# Altium footprint library CUSTOM PCB.PcbLib: 404 footprints (part 19 of 26)
Each footprint in its own frame and in the unit in brackets; x right, y up, seen from the top. Pads: shape width x height; smd on the part's side, far side on the other; paste and mask are expansions set on the pad; w line width, h text height; cw(c..) or ccw(c..) is an arc to the next point about the centre after c.
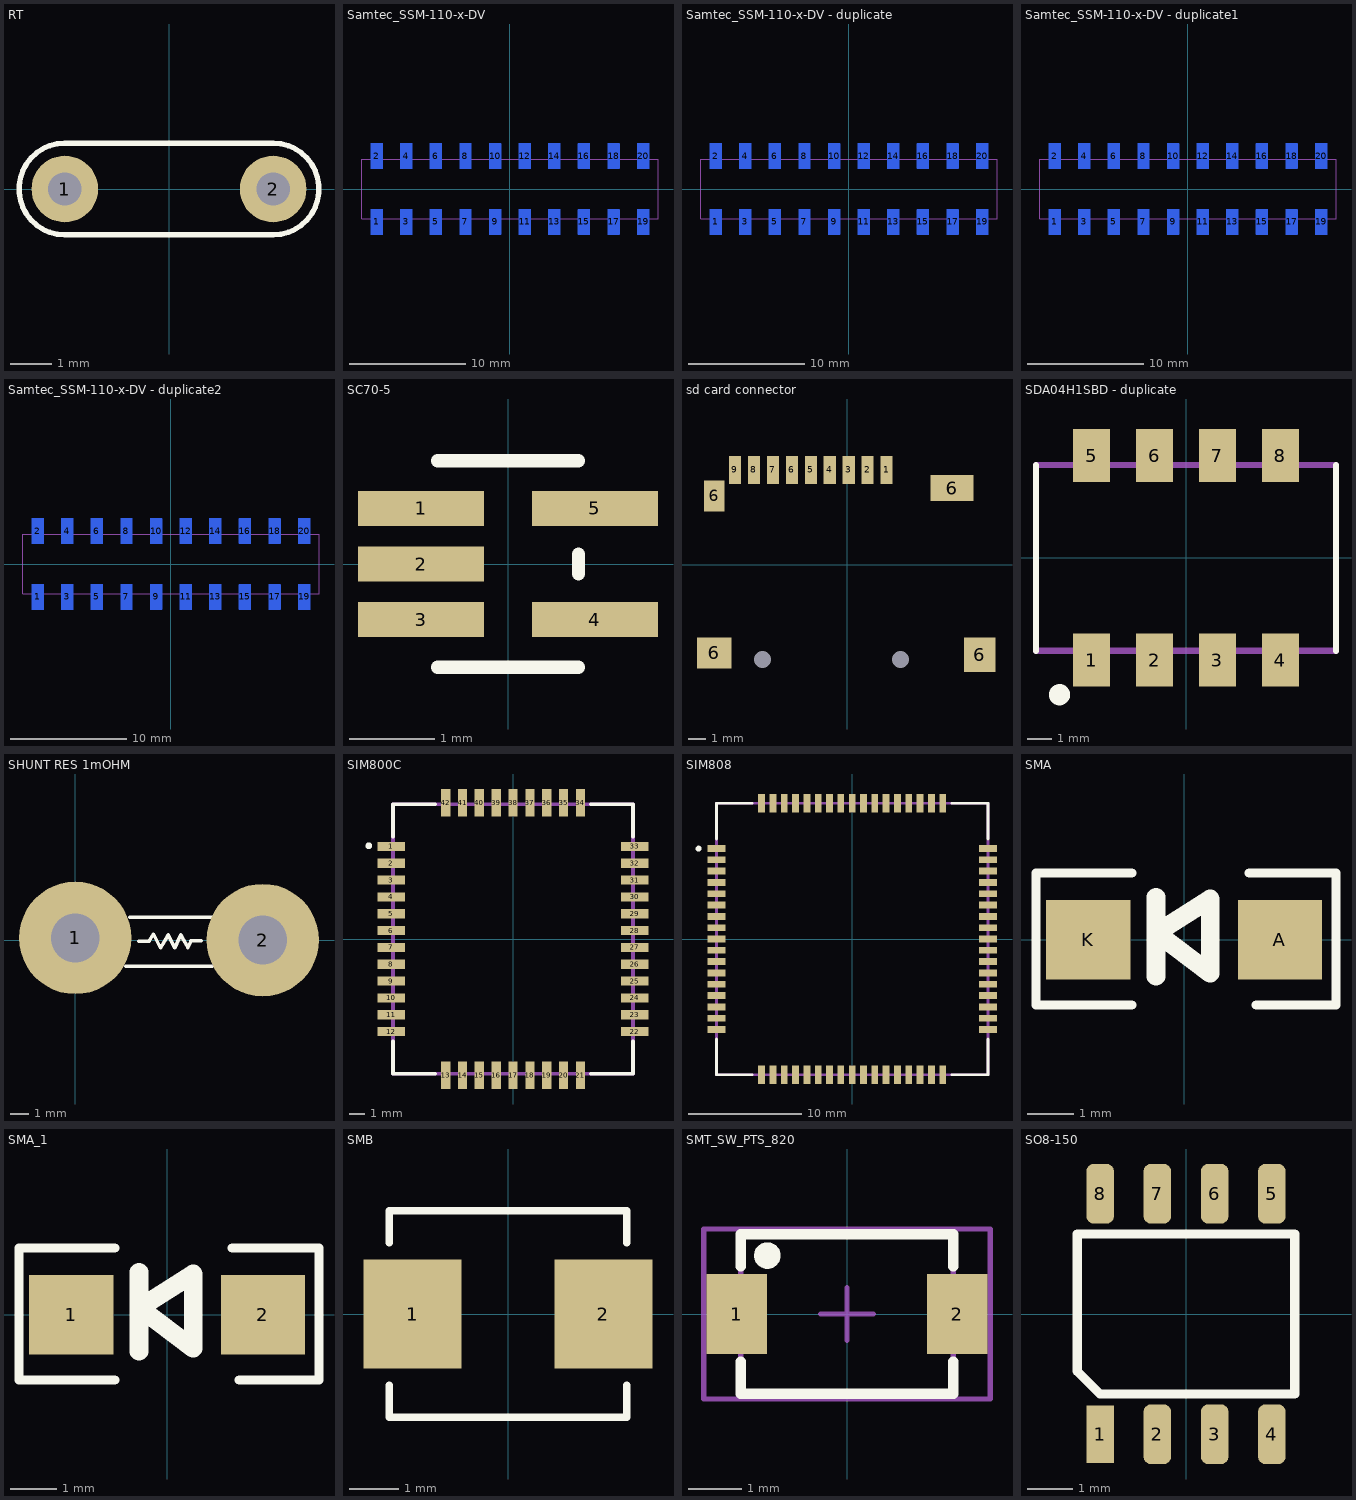
[diagram p18: the footprints below, top view; thin cyan lines are the x and y axes]

## RT [mm]
pads (2):
  round 1.6 hole 0.8: 1(-2.5,0) 2(2.5,0)
Top Overlay:
  lines w0.127: -2.5,-1.1 cw(c-2.5,0) -2.5,1.1 2.5,1.1 cw(c2.5,0) 2.5,-1.1 -2.5,-1.1

## Samtec_SSM-110-x-DV [mm] "Receptacle, 2.54mm, 10x2, SMT"
height 7.47
pads (20):
  rrect10% 1.02x2.22 smd far side: 1(-11.43,-2.825) 2(-11.43,2.825) 3(-8.89,-2.825) 4(-8.89,2.825) 5(-6.35,-2.825) 6(-6.35,2.825) 7(-3.81,-2.825) 8(-3.81,2.825) 9(-1.27,-2.825) 10(-1.27,2.825) 11(1.27,-2.825) 12(1.27,2.825) 13(3.81,-2.825) 14(3.81,2.825) 15(6.35,-2.825) 16(6.35,2.825) 17(8.89,-2.825) 18(8.89,2.825) 19(11.43,-2.825) 20(11.43,2.825)
Bottom Overlay:
  rectangle: -13.025,-2.225 -12.675,-1.625
  lines w0.2: -12.34,-2.54 -12.7,-2.54 -12.7,2.54 -12.34,2.54 ; 12.34,-2.54 12.7,-2.54 12.7,2.54 12.34,2.54
Mechanical 6:
  lines w0.1: -11.684,-2.54 -11.684,-3.518 -11.176,-3.518 -11.176,-2.54 ; -11.684,2.54 -11.684,3.518 -11.176,3.518 -11.176,2.54 ; -9.144,-2.54 -9.144,-3.518 -8.636,-3.518 -8.636,-2.54 ; -9.144,2.54 -9.144,3.518 -8.636,3.518 -8.636,2.54 ; -6.604,-2.54 -6.604,-3.518 -6.096,-3.518 -6.096,-2.54 ; -6.604,2.54 -6.604,3.518 -6.096,3.518 -6.096,2.54 ; -4.064,-2.54 -4.064,-3.518 -3.556,-3.518 -3.556,-2.54 ; -4.064,2.54 -4.064,3.518 -3.556,3.518 -3.556,2.54 ; -1.524,-2.54 -1.524,-3.518 -1.016,-3.518 -1.016,-2.54 ; -1.524,2.54 -1.524,3.518 -1.016,3.518 -1.016,2.54 ; 1.016,-2.54 1.016,-3.518 1.524,-3.518 1.524,-2.54 ; 1.016,2.54 1.016,3.518 1.524,3.518 1.524,2.54 ; 3.556,-2.54 3.556,-3.518 4.064,-3.518 4.064,-2.54 ; 3.556,2.54 3.556,3.518 4.064,3.518 4.064,2.54 ; 6.096,-2.54 6.096,-3.518 6.604,-3.518 6.604,-2.54 ; 6.096,2.54 6.096,3.518 6.604,3.518 6.604,2.54 ; 8.636,-2.54 8.636,-3.518 9.144,-3.518 9.144,-2.54 ; 8.636,2.54 8.636,3.518 9.144,3.518 9.144,2.54 ; 11.176,-2.54 11.176,-3.518 11.684,-3.518 11.684,-2.54 ; 11.176,2.54 11.176,3.518 11.684,3.518 11.684,2.54 ; -12.7,-2.54 12.7,-2.54 12.7,2.54 -12.7,2.54 -12.7,-2.54
  text ".Designator" at -0.182,-0.028 h1.02
3D body "SSM-110-S-DV.stp": height 7.42, standoff 0, extent -12.7,-3.518 12.7,3.518

## Samtec_SSM-110-x-DV - duplicate [mm] "Receptacle, 2.54mm, 10x2, SMT"
height 7.47
pads (20):
  rrect10% 1.02x2.22 smd far side: 1(-11.43,-2.825) 2(-11.43,2.825) 3(-8.89,-2.825) 4(-8.89,2.825) 5(-6.35,-2.825) 6(-6.35,2.825) 7(-3.81,-2.825) 8(-3.81,2.825) 9(-1.27,-2.825) 10(-1.27,2.825) 11(1.27,-2.825) 12(1.27,2.825) 13(3.81,-2.825) 14(3.81,2.825) 15(6.35,-2.825) 16(6.35,2.825) 17(8.89,-2.825) 18(8.89,2.825) 19(11.43,-2.825) 20(11.43,2.825)
Bottom Overlay:
  rectangle: -13.025,-2.225 -12.675,-1.625
  lines w0.2: -12.34,-2.54 -12.7,-2.54 -12.7,2.54 -12.34,2.54 ; 12.34,-2.54 12.7,-2.54 12.7,2.54 12.34,2.54
Mechanical 6:
  lines w0.1: -11.684,-2.54 -11.684,-3.518 -11.176,-3.518 -11.176,-2.54 ; -11.684,2.54 -11.684,3.518 -11.176,3.518 -11.176,2.54 ; -9.144,-2.54 -9.144,-3.518 -8.636,-3.518 -8.636,-2.54 ; -9.144,2.54 -9.144,3.518 -8.636,3.518 -8.636,2.54 ; -6.604,-2.54 -6.604,-3.518 -6.096,-3.518 -6.096,-2.54 ; -6.604,2.54 -6.604,3.518 -6.096,3.518 -6.096,2.54 ; -4.064,-2.54 -4.064,-3.518 -3.556,-3.518 -3.556,-2.54 ; -4.064,2.54 -4.064,3.518 -3.556,3.518 -3.556,2.54 ; -1.524,-2.54 -1.524,-3.518 -1.016,-3.518 -1.016,-2.54 ; -1.524,2.54 -1.524,3.518 -1.016,3.518 -1.016,2.54 ; 1.016,-2.54 1.016,-3.518 1.524,-3.518 1.524,-2.54 ; 1.016,2.54 1.016,3.518 1.524,3.518 1.524,2.54 ; 3.556,-2.54 3.556,-3.518 4.064,-3.518 4.064,-2.54 ; 3.556,2.54 3.556,3.518 4.064,3.518 4.064,2.54 ; 6.096,-2.54 6.096,-3.518 6.604,-3.518 6.604,-2.54 ; 6.096,2.54 6.096,3.518 6.604,3.518 6.604,2.54 ; 8.636,-2.54 8.636,-3.518 9.144,-3.518 9.144,-2.54 ; 8.636,2.54 8.636,3.518 9.144,3.518 9.144,2.54 ; 11.176,-2.54 11.176,-3.518 11.684,-3.518 11.684,-2.54 ; 11.176,2.54 11.176,3.518 11.684,3.518 11.684,2.54 ; -12.7,-2.54 -12.7,2.54 12.7,2.54 12.7,-2.54 -12.7,-2.54
  text ".Designator" at -0.182,-0.028 h1.02
3D body "SSM-110-S-DV.stp": height 7.42, standoff 0, extent -12.7,-3.518 12.7,3.518

## Samtec_SSM-110-x-DV - duplicate1 [mm] "Receptacle, 2.54mm, 10x2, SMT"
height 7.47
pads (20):
  rrect10% 1.02x2.22 smd far side: 1(-11.43,-2.825) 2(-11.43,2.825) 3(-8.89,-2.825) 4(-8.89,2.825) 5(-6.35,-2.825) 6(-6.35,2.825) 7(-3.81,-2.825) 8(-3.81,2.825) 9(-1.27,-2.825) 10(-1.27,2.825) 11(1.27,-2.825) 12(1.27,2.825) 13(3.81,-2.825) 14(3.81,2.825) 15(6.35,-2.825) 16(6.35,2.825) 17(8.89,-2.825) 18(8.89,2.825) 19(11.43,-2.825) 20(11.43,2.825)
Bottom Overlay:
  rectangle: -13.025,-2.225 -12.675,-1.625
  lines w0.2: -12.34,-2.54 -12.7,-2.54 -12.7,2.54 -12.34,2.54 ; 12.34,-2.54 12.7,-2.54 12.7,2.54 12.34,2.54
Mechanical 6:
  lines w0.1: -11.684,-2.54 -11.684,-3.518 -11.176,-3.518 -11.176,-2.54 ; -11.684,2.54 -11.684,3.518 -11.176,3.518 -11.176,2.54 ; -9.144,-2.54 -9.144,-3.518 -8.636,-3.518 -8.636,-2.54 ; -9.144,2.54 -9.144,3.518 -8.636,3.518 -8.636,2.54 ; -6.604,-2.54 -6.604,-3.518 -6.096,-3.518 -6.096,-2.54 ; -6.604,2.54 -6.604,3.518 -6.096,3.518 -6.096,2.54 ; -4.064,-2.54 -4.064,-3.518 -3.556,-3.518 -3.556,-2.54 ; -4.064,2.54 -4.064,3.518 -3.556,3.518 -3.556,2.54 ; -1.524,-2.54 -1.524,-3.518 -1.016,-3.518 -1.016,-2.54 ; -1.524,2.54 -1.524,3.518 -1.016,3.518 -1.016,2.54 ; 1.016,-2.54 1.016,-3.518 1.524,-3.518 1.524,-2.54 ; 1.016,2.54 1.016,3.518 1.524,3.518 1.524,2.54 ; 3.556,-2.54 3.556,-3.518 4.064,-3.518 4.064,-2.54 ; 3.556,2.54 3.556,3.518 4.064,3.518 4.064,2.54 ; 6.096,-2.54 6.096,-3.518 6.604,-3.518 6.604,-2.54 ; 6.096,2.54 6.096,3.518 6.604,3.518 6.604,2.54 ; 8.636,-2.54 8.636,-3.518 9.144,-3.518 9.144,-2.54 ; 8.636,2.54 8.636,3.518 9.144,3.518 9.144,2.54 ; 11.176,-2.54 11.176,-3.518 11.684,-3.518 11.684,-2.54 ; 11.176,2.54 11.176,3.518 11.684,3.518 11.684,2.54 ; -12.7,-2.54 12.7,-2.54 12.7,2.54 -12.7,2.54 -12.7,-2.54
  text ".Designator" at -0.182,-0.028 h1.02
3D body "SSM-110-S-DV.stp": height 7.42, standoff 0, extent -12.7,-3.518 12.7,3.518

## Samtec_SSM-110-x-DV - duplicate2 [mm] "Receptacle, 2.54mm, 10x2, SMT"
height 7.47
pads (20):
  rrect10% 1.02x2.22 smd far side: 1(-11.43,-2.825) 2(-11.43,2.825) 3(-8.89,-2.825) 4(-8.89,2.825) 5(-6.35,-2.825) 6(-6.35,2.825) 7(-3.81,-2.825) 8(-3.81,2.825) 9(-1.27,-2.825) 10(-1.27,2.825) 11(1.27,-2.825) 12(1.27,2.825) 13(3.81,-2.825) 14(3.81,2.825) 15(6.35,-2.825) 16(6.35,2.825) 17(8.89,-2.825) 18(8.89,2.825) 19(11.43,-2.825) 20(11.43,2.825)
Bottom Overlay:
  rectangle: -13.025,-2.225 -12.675,-1.625
  lines w0.2: -12.34,-2.54 -12.7,-2.54 -12.7,2.54 -12.34,2.54 ; 12.34,-2.54 12.7,-2.54 12.7,2.54 12.34,2.54
Mechanical 6:
  lines w0.1: -11.684,-2.54 -11.684,-3.518 -11.176,-3.518 -11.176,-2.54 ; -11.684,2.54 -11.684,3.518 -11.176,3.518 -11.176,2.54 ; -9.144,-2.54 -9.144,-3.518 -8.636,-3.518 -8.636,-2.54 ; -9.144,2.54 -9.144,3.518 -8.636,3.518 -8.636,2.54 ; -6.604,-2.54 -6.604,-3.518 -6.096,-3.518 -6.096,-2.54 ; -6.604,2.54 -6.604,3.518 -6.096,3.518 -6.096,2.54 ; -4.064,-2.54 -4.064,-3.518 -3.556,-3.518 -3.556,-2.54 ; -4.064,2.54 -4.064,3.518 -3.556,3.518 -3.556,2.54 ; -1.524,-2.54 -1.524,-3.518 -1.016,-3.518 -1.016,-2.54 ; -1.524,2.54 -1.524,3.518 -1.016,3.518 -1.016,2.54 ; 1.016,-2.54 1.016,-3.518 1.524,-3.518 1.524,-2.54 ; 1.016,2.54 1.016,3.518 1.524,3.518 1.524,2.54 ; 3.556,-2.54 3.556,-3.518 4.064,-3.518 4.064,-2.54 ; 3.556,2.54 3.556,3.518 4.064,3.518 4.064,2.54 ; 6.096,-2.54 6.096,-3.518 6.604,-3.518 6.604,-2.54 ; 6.096,2.54 6.096,3.518 6.604,3.518 6.604,2.54 ; 8.636,-2.54 8.636,-3.518 9.144,-3.518 9.144,-2.54 ; 8.636,2.54 8.636,3.518 9.144,3.518 9.144,2.54 ; 11.176,-2.54 11.176,-3.518 11.684,-3.518 11.684,-2.54 ; 11.176,2.54 11.176,3.518 11.684,3.518 11.684,2.54 ; -12.7,-2.54 -12.7,2.54 12.7,2.54 12.7,-2.54 -12.7,-2.54
  text ".Designator" at -0.182,-0.028 h1.02
3D body "SSM-110-S-DV.stp": height 7.42, standoff 0, extent -12.7,-3.518 12.7,3.518

## SC70-5 [mil]
pads (5):
  rect 58x16 smd paste+0 mask+0: 1(-40,25.59) 2(-40,0) 3(-40,-25.59) 4(40,-25.59) 5(40,25.59)
Top Overlay:
  lines w6: -32.5,-47.5 32.5,-47.5 ; -32.5,47.5 32.5,47.5 ; 32.5,-4.49 32.5,4.49
3D body "DCK5-M.step": height 43.11, standoff 0, extent -47.01,-42.52 47.01,42.52

## sd card connector [mm]
pads (15):
  rect 0.7x1.6 smd: 1(2.3,5.499) 2(1.2,5.499) 3(0.1,5.499) 4(-1,5.499) 5(-2.1,5.499) 6(-3.2,5.499) 7(-4.3,5.499) 8(-5.4,5.499) 9(-6.5,5.499)
  rect 2x1.8 smd: 6(-7.7,-5.109)
  rect 1.2x1.8 smd: 6(-7.7,3.999)
  round 0 hole 1: 6(-4.9,-5.499) 6(3.1,-5.499)
  rect 2.5x1.5 smd: 6(6.1,4.452)
  rect 1.8x2 smd: 6(7.7,-5.209)
3D body "DM3AT-SF-PEJM5--3DModel-STEP-56544.STEP": height 1.68, standoff 0, extent -7.379,-9.898 6.471,6.252

## SDA04H1SBD - duplicate [mm]
pads (8):
  rect 1.5x2.15 smd: 1(-3.81,-4.125) 2(-1.27,-4.125) 3(1.27,-4.125) 4(3.81,-4.125) 5(-3.81,4.125) 6(-1.27,4.125) 7(1.27,4.125) 8(3.81,4.125)
Top Overlay:
  circle w0.5: c-5.101,-5.52 r0.178
  lines w0.254: -6.05,-3.745 -6.05,3.745 ; 6.05,-3.745 6.05,3.745
Mechanical 13:
  lines w0.254: -6.05,-3.745 6.05,-3.745 6.05,3.745 -6.05,3.745 -6.05,-3.745

## SHUNT RES 1mOHM [mm]
pads (2):
  round 6 hole 2.6: 1(0,0.11) 2(10,0)
Top Overlay:
  lines w0.19: 2.69,-1.41 7.31,-1.4 ; 2.91,1.21 7.61,1.21 ; 3.38,-0.06 3.94,-0.06 4.17,0.32 4.55,-0.42 4.96,0.28 5.3,-0.42 5.63,0.28 6.01,-0.41 6.17,-0.05 6.305,-0.05 6.575,-0.05 6.71,-0.05
3D body: height 12.4, standoff 7.6, extent -0.05,-2.32 9.95,2.48
3D body: height 10, standoff 0, extent -2.52,-2.317 2.28,2.483
3D body: height 10, standoff 0, extent 7.37,-2.32 12.17,2.48
3D body: height 12.4, standoff 7.6, extent 7.37,-2.315 12.159,2.48
3D body: height 12.4, standoff 7.6, extent -2.52,-2.317 2.269,2.477
3D body: height 1, standoff -1, extent -0.992,-0.888 1,1.108
3D body: height 1, standoff -1, extent 9.008,-0.998 11,0.998

## SIM800C [mm]
pads (42):
  rect 1.8x0.6 smd: 1(-7.95,6.05) 2(-7.95,4.95) 3(-7.95,3.85) 4(-7.95,2.75) 5(-7.95,1.65) 6(-7.95,0.55) 7(-7.95,-0.55) 8(-7.95,-1.65) 9(-7.95,-2.75) 10(-7.95,-3.85) 11(-7.95,-4.95) 12(-7.95,-6.05) 22(7.95,-6.05) 23(7.95,-4.95) 24(7.95,-3.85) 25(7.95,-2.75) 26(7.95,-1.65) 27(7.95,-0.55) 28(7.95,0.55) 29(7.95,1.65) 30(7.95,2.75) 31(7.95,3.85) 32(7.95,4.95) 33(7.95,6.05)
  rect 0.6x1.8 smd: 13(-4.4,-8.9) 14(-3.3,-8.9) 15(-2.2,-8.9) 16(-1.1,-8.9) 17(0,-8.9) 18(1.1,-8.9) 19(2.2,-8.9) 20(3.3,-8.9) 21(4.4,-8.9) 34(4.4,8.9) 35(3.3,8.9) 36(2.2,8.9) 37(1.1,8.9) 38(0,8.9) 39(-1.1,8.9) 40(-2.2,8.9) 41(-3.3,8.9) 42(-4.4,8.9)
Top Overlay:
  circle w0.254: c-9.416,6.091 r0.089
  lines w0.254: -7.85,-6.7 -7.85,-8.8 -5.1,-8.8 ; -7.85,6.7 -7.85,8.8 -5.1,8.8 ; 5.1,-8.8 7.85,-8.8 7.85,-6.7 ; 5.1,8.8 7.85,8.8 7.85,6.7
Mechanical 13:
  lines w0.254: -7.85,-8.8 -7.85,8.8 7.85,8.8 7.85,-8.8 -7.85,-8.8
3D body: height 0.8, standoff 0, extent -7.85,-8.8 7.85,8.8
3D body: height 1.5, standoff 0.8, extent -6.95,-7.9 6.95,7.9

## SIM808 [mm]
pads (68):
  rect 1.6x0.6 smd: 1(-12,8) 2(-12,7) 3(-12,6) 4(-12,5) 5(-12,4) 6(-12,3) 7(-12,2) 8(-12,1) 9(-12,0) 10(-12,-1) 11(-12,-2) 12(-12,-3) 13(-12,-4) 14(-12,-5) 15(-12,-6) 16(-12,-7) 17(-12,-8) 35(12,-8) 36(12,-7) 37(12,-6) 38(12,-5) 39(12,-4) 40(12,-3) 41(12,-2) 42(12,-1) 43(12,0) 44(12,1) 45(12,2) 46(12,3) 47(12,4) 48(12,5) 49(12,6) 50(12,7) 51(12,8)
  rect 0.6x1.6 smd: 18(-8,-12) 19(-7,-12) 20(-6,-12) 21(-5,-12) 22(-4,-12) 23(-3,-12) 24(-2,-12) 25(-1,-12) 26(0,-12) 27(1,-12) 28(2,-12) 29(3,-12) 30(4,-12) 31(5,-12) 32(6,-12) 33(7,-12) 34(8,-12) 52(8,12) 53(7,12) 54(6,12) 55(5,12) 56(4,12) 57(3,12) 58(2,12) 59(1,12) 60(0,12) 61(-1,12) 62(-2,12) 63(-3,12) 64(-4,12) 65(-5,12) 66(-6,12) 67(-7,12) 68(-8,12)
Top Overlay:
  circle w0.254: c-13.572,7.983 r0.14
  lines w0.254: -12,-8.825 -12,-12 -8.825,-12 ; -12,8.825 -12,12 -8.825,12 ; 8.825,-12 12,-12 12,-8.825 ; 8.825,12 12,12 12,8.825
Mechanical 13:
  lines w0.254: -12,-12 -12,12 12,12 12,-12 -12,-12

## SMA [mm]
pads (2):
  rect 1.8x1.7 smd: A(2.05,0) K(-2.05,0)
Top Overlay:
  lines w0.2: -1.12,-1.395 -3.167,-1.395 -3.167,1.433 -1.12,1.433 ; 1.399,1.433 3.252,1.433 3.252,-1.395 1.546,-1.395
  lines w0.4: -0.6,-0.775 -0.6,0.91 ; -0.587,0.15 0.559,-0.716 0.559,0.876 -0.587,0.15
3D body "User Library-DO-214AC(SMA).STEP": height 2.21, standoff -0.08, extent -2.744,-1.397 2.743,1.396

## SMA_1 [mm]
pads (2):
  rect 1.8x1.7 smd: 1(-2.05,0) 2(2.05,0)
Top Overlay:
  lines w0.2: -1.12,-1.395 -3.167,-1.395 -3.167,1.433 -1.12,1.433 ; 1.399,1.433 3.252,1.433 3.252,-1.395 1.546,-1.395
  lines w0.4: -0.6,-0.775 -0.6,0.91 ; -0.587,0.15 0.559,-0.716 0.559,0.876 -0.587,0.15
3D body "User Library-DO-214AC(SMA).STEP": height 2.21, standoff -0.08, extent -2.744,-1.397 2.743,1.396

## SMB [mm]
pads (2):
  rect 2x2.23 smd paste+0 mask+0: 1(-1.944,0) 2(1.944,0)
Top Overlay:
  lines w0.152: -2.426,-1.448 -2.426,-2.108 2.426,-2.108 2.426,-1.448 ; -2.426,1.448 -2.426,2.108 2.426,2.108 2.426,1.448
3D body "SMB-L.step": height 3.14, standoff -0.05, extent -2.794,-1.981 2.794,1.981

## SMT_SW_PTS_820 [mm] "SMT Tactile ?Switch PTS 820 Series"
height 2
pads (4):
  rect 1.143x1.5 smd: 1(-2.075,0) 2(2.075,0)
  round 0 all layers, no hole paste-2.54 mask-2.54: MH1(0,0.9) MH2(0,-0.9)
Top Overlay:
  circle w0.25: c-1.5,1.1 r0.125
  lines w0.2: -2,-0.9 -2,-1.5 2,-1.5 2,-0.9 ; -2,0.9 -2,1.5 2,1.5 2,0.9
Mechanical 13:
  lines w0.1: -2,-1.5 -2,1.5 2,1.5 2,-1.5 -2,-1.5
Mechanical 15:
  lines w0.1: -0.5,0 0.5,0 ; 0,-0.5 0,0.5 ; -2.7,-1.6 -2.7,1.6 2.7,1.6 2.7,-1.6 -2.7,-1.6
3D body "SMT Tactile Switch PTS-820.STEP": height 2.05, standoff -0.5, extent -2.25,-1.55 2.25,1.55

## SO8-150 [mil]
pads (8):
  rect 24x50 smd mask+4: 1(-75,-105)
  rrect50% 24x52 smd mask+4: 2(-25,-105) 3(25,-105) 4(75,-105) 5(75,105) 6(25,105) 7(-25,105) 8(-75,105)
Top Overlay:
  lines w8: -95.01,-49.99 -75,-70 95,-70 95,70 -95.01,70 -95.01,-49.99
3D body "SO8-150.STEP": height 67, standoff 0, extent -95.01,-122.01 94.99,121.99